# Altium footprint library Pcblib.PcbLib: 281 footprints (part 18 of 18)
Each footprint in its own frame and in the unit in brackets; x right, y up, seen from the top. Pads: shape width x height; smd on the part's side, far side on the other; paste and mask are expansions set on the pad; w line width, h text height; cw(c..) or ccw(c..) is an arc to the next point about the centre after c.
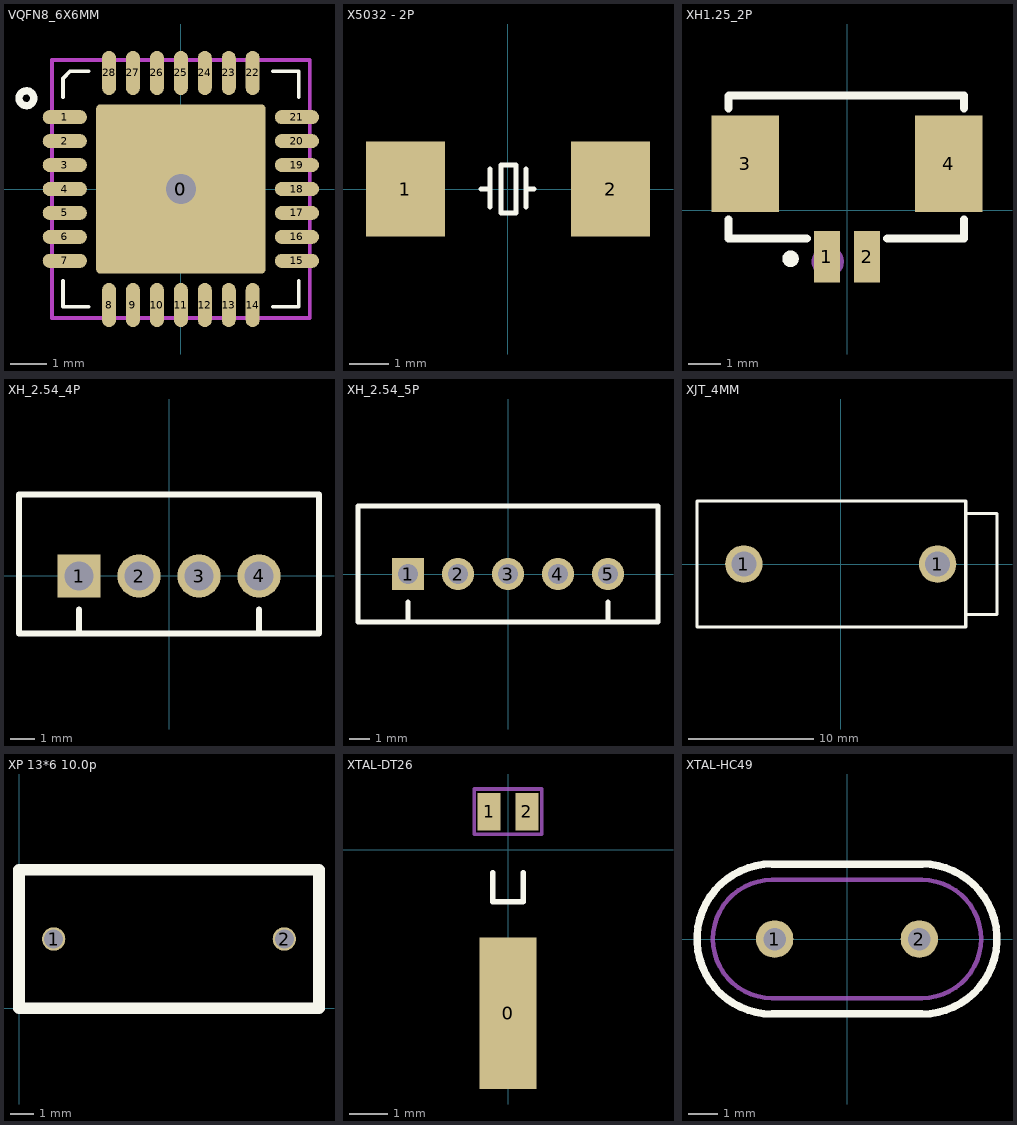
[diagram p17: the footprints below, top view; thin cyan lines are the x and y axes]

## VQFN8_6X6MM [mm] "28 Leads, Body 6.0x6.0mm, Pitch 0.65mm, VQFN28"
height 1
pads (30):
  rrect5% 4.6x4.6 smd: 0(0,0)
  round 1.016 hole 0.813: 0(0,0)
  oval 1.2x0.38 smd: 1(-3.15,1.95) 2(-3.15,1.3) 3(-3.15,0.65) 4(-3.15,0) 5(-3.15,-0.65) 6(-3.15,-1.3) 7(-3.15,-1.95) 15(3.15,-1.95) 16(3.15,-1.3) 17(3.15,-0.65) 18(3.15,0) 19(3.15,0.65) 20(3.15,1.3) 21(3.15,1.95)
  oval 0.38x1.2 smd: 8(-1.95,-3.15) 9(-1.3,-3.15) 10(-0.65,-3.15) 11(0,-3.15) 12(0.65,-3.15) 13(1.3,-3.15) 14(1.95,-3.15) 22(1.95,3.15) 23(1.3,3.15) 24(0.65,3.15) 25(0,3.15) 26(-0.65,3.15) 27(-1.3,3.15) 28(-1.95,3.15)
Top Overlay:
  circle w0.2: c-4.194,2.464 r0.2
  lines w0.1: -3.2,-2.5 -3.2,-3.2 -2.5,-3.2 ; -3.2,2.5 -3.2,3 -3,3.2 -2.5,3.2 ; 2.5,-3.2 3.2,-3.2 3.2,-2.5 ; 2.5,3.2 3.2,3.2 3.2,2.5
Top Paste:
  region: -1.524,1.524 -1.524,-1.524 1.524,-1.524 1.524,1.524
Mechanical 15 keep-out:
  lines w0.1: -3.5,-3.5 3.5,-3.5 3.5,3.5 -3.5,3.5 -3.5,-3.5
3D body: height 1, standoff 0.05, extent -3,-3 3,3

## X5032 - 2P [mm]
pads (2):
  rect 2x2.4 smd: 1(-2.6,0) 2(2.6,0)
Top Overlay:
  lines w0.127: -0.686,0 -0.457,0 ; -0.457,-0.457 -0.457,0.508 ; 0.457,-0.457 0.457,0.508 ; 0.457,0 0.66,0 ; -0.178,-0.61 -0.178,0.61 0.203,0.61 0.203,-0.61 -0.178,-0.61
3D body: height 0.8, standoff 0.79, extent -2.159,-1.143 2.159,1.143

## XH1.25_2P [mm]
pads (4):
  rect 0.8x1.6 smd: 1(-0.625,-1.45) 2(0.625,-1.45)
  rect 2.1x3 smd: 3(-3.175,1.45) 4(3.175,1.45)
Top Overlay:
  circle w0.254: c-1.76,-1.51 r0.13
  lines w0.254: -3.695,-0.281 -3.695,-0.88 -1.256,-0.88 ; -3.695,3.181 -3.695,3.56 ; -3.675,3.58 3.645,3.58 3.645,3.181 ; 1.256,-0.88 3.645,-0.88 3.645,-0.281
Mechanical 15:
  circle w0.5: c-0.6,-1.6 r0.25

## XH_2.54_4P [mm]
pads (4):
  rect 1.8x1.8 hole 1.199: 1(-3.75,0)
  round 1.8 hole 1.199: 2(-1.25,0) 3(1.25,0) 4(3.75,0)
Top Overlay:
  lines w0.254: -3.75,-2.4 -3.75,-1.4 ; 3.75,-2.4 3.75,-1.4 ; -6.25,-2.4 6.25,-2.4 6.25,3.4 -6.25,3.4 -6.25,-2.4

## XH_2.54_5P [mm]
pads (5):
  rect 1.6x1.6 hole 1: 1(-5,0)
  round 1.6 hole 1: 2(-2.5,0) 3(0,0) 4(2.5,0) 5(5,0)
Top Overlay:
  lines w0.254: -5,-2.4 -5,-1.4 ; 5,-2.4 5,-1.4 ; -7.5,-2.4 -7.5,3.4 7.5,3.4 7.5,-2.4 -7.5,-2.4

## XJT_4MM [mm]
pads (2):
  round 3 hole 2: 1(-7.75,0) 1(7.75,0)
Top Overlay:
  lines w0.254: 10,-4.05 12.5,-4.05 12.5,4.05 10,4.05 ; -11.5,-5.05 10,-5.05 10,5.05 -11.5,5.05 -11.5,-5.05

## XP 13*6 10.0p [mil]
pads (2):
  round 40 hole 32: 1(59.06,118.11) 2(452.76,118.11)
Top Overlay:
  lines w20: 0,0 511.81,0 511.81,236.22 0,236.22 0,0

## XTAL-DT26 [mm] "32.768KHz_2x1.2mm"
pads (3):
  rect 1.5x4 smd: 0(0,-4.318)
  rect 0.6x1 smd: 1(-0.5,1) 2(0.5,1)
Top Overlay:
  lines w0.15: -0.406,-0.61 -0.406,-1.372 0.394,-1.372 ; 0.4,-1.365 0.4,-0.61
Mechanical 13:
  lines w0.1: -0.889,0.406 -0.889,1.6 0.889,1.6 0.889,0.406 -0.889,0.406
3D body: height 0.4, standoff 0, extent -0.584,-6.35 0.584,1.499

## XTAL-HC49 [mm]
height 3.5
pads (2):
  round 1.27 hole 0.762: 1(-2.45,0) 2(2.45,0)
Top Overlay:
  lines w0.254: -2.54,-2.54 cw(c-2.54,0) -2.54,2.54 2.54,2.54 cw(c2.54,0) 2.54,-2.54 -2.54,-2.54
Mechanical 5:
  lines w0.15: -2.54,-2 cw(c-2.54,0) -2.54,2 2.54,2 cw(c2.54,0) 2.54,-2 -2.54,-2